# Altium footprint library heromap.PcbLib: 593 footprints (part 20 of 38)
Each footprint in its own frame and in the unit in brackets; x right, y up, seen from the top. Pads: shape width x height; smd on the part's side, far side on the other; paste and mask are expansions set on the pad; w line width, h text height; cw(c..) or ccw(c..) is an arc to the next point about the centre after c.
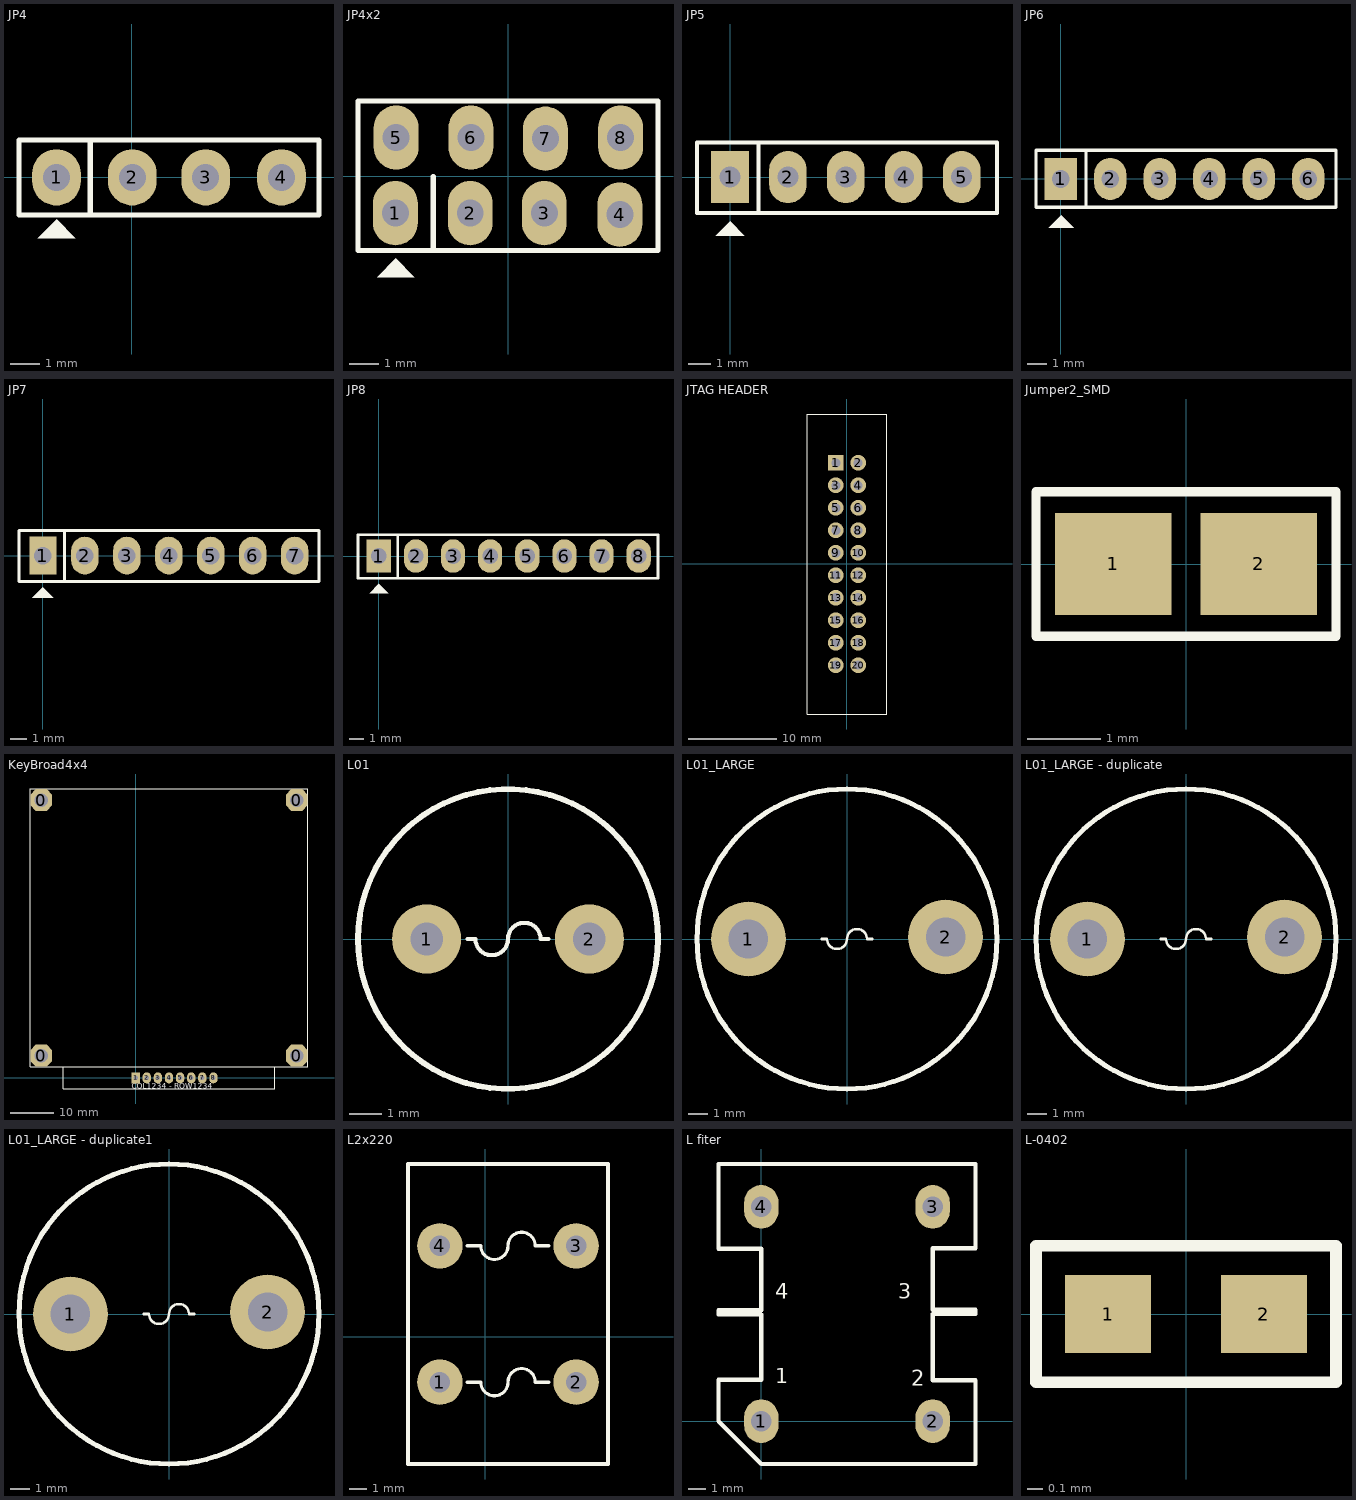
[diagram p19: the footprints below, top view; thin cyan lines are the x and y axes]

## JP4 [mil] "Jumper 4"
height 200
pads (4):
  oval 65x75 hole 36: 1(-100,0) 2(1,0) 3(99,0) 4(200,0)
Top Overlay:
  region: -100,-56 -125,-81 -75,-81
  lines w7: -55,-50 -55,49 ; -150,-50 250,-50 250,50 -150,50 -150,-50

## JP4x2 [mil] "Connector 4x2"
height 200
pads (8):
  oval 60x86 hole 36: 1(-150.5,-49.5) 2(-50.5,-49.5) 3(48.5,-49.5) 4(149.5,-51.5) 5(-149.5,51.5) 6(-49.5,51.5) 7(50,50) 8(150.5,51.5)
Top Overlay:
  region: -150,-110 -175,-135 -125,-135
  lines w7: -100,-99 -100,-1 ; -200.5,-99.5 -200.5,0.5 -200.5,100.5 200.5,100.5 200.5,-99.5 -200.5,-99.5

## JP5 [mil] "JP5"
height 200
pads (5):
  rect 65x90 hole 36: 1(0,0)
  oval 65x90 hole 36: 2(100,0) 3(200,0) 4(300,0) 5(400,0)
Top Overlay:
  region: 0,-76 -25,-101 25,-101
  lines w7: 49,-60 49,58 ; -57,-62 461,-62 461,60 -57,60 -57,-62

## JP6 [mil] "JP6"
height 200
pads (6):
  rect 65x85 hole 36: 1(0,0)
  oval 65x85 hole 36: 2(100,0) 3(200,0) 4(300,0) 5(400,0) 6(500,0)
Top Overlay:
  region: 1,-74 -24,-99 26,-99
  lines w7: 51,-57 51,56 ; -50,-57 556,-57 556,58 -50,58 -50,-57

## JP7 [mil] "JP7"
height 200
pads (7):
  rect 65x90 hole 42: 1(0,0)
  oval 65x90 hole 42: 2(100,0) 3(200,0) 4(300,0) 5(400,0) 6(500,0) 7(600,0)
Top Overlay:
  region: 0,-75 -25,-100 25,-100
  lines w7: 51,-58 51,60 ; -57,-62 -57,60 658,60 658,-62 -57,-62

## JP8 [mil] "JP8"
height 200
pads (8):
  rect 65x90 hole 42: 1(0,0)
  oval 65x90 hole 42: 2(100,0) 3(200,0) 4(300,0) 5(400,0) 6(500,0) 7(600,0) 8(700,0)
Top Overlay:
  region: 0,-75 -25,-100 25,-100
  lines w7: 51,-60 51,56 ; -56,-60 752,-60 752,57 -56,57 -56,-60

## JTAG HEADER [mil]
pads (20):
  rect 70x70 hole 40: 1(-49,449)
  round 70 hole 40: 2(51,449) 3(-49,349) 4(51,349) 5(-49,249) 6(51,249) 7(-49,149) 8(51,149) 9(-49,49) 10(51,49) 11(-49,-51) 12(51,-51) 13(-49,-151) 14(51,-151) 15(-49,-251) 16(51,-251) 17(-49,-351) 18(51,-351) 19(-49,-451) 20(51,-451)
Top Overlay:
  lines w4: -66,665.85 9,665.85 ; -176.48,-667.85 -176.48,665.85 178.48,665.85 178.48,-667.85 -176.48,-667.85
3D body: height 354.33, standoff 0, extent -160,-647.85 158.48,645.85
3D body: height 314.96, standoff -39.37, extent 31.02,-470.98 70.98,-431.02
3D body: height 314.96, standoff -39.37, extent -69.98,-469.98 -30.02,-430.02
3D body: height 314.96, standoff -39.37, extent -68.98,-370.98 -29.02,-331.02
3D body: height 314.96, standoff -39.37, extent 31.02,-370.98 70.98,-331.02
3D body: height 314.96, standoff -39.37, extent 31.02,-270.98 70.98,-231.02
3D body: height 314.96, standoff -39.37, extent -68.98,-270.98 -29.02,-231.02
3D body: height 314.96, standoff -39.37, extent 31.02,-170.98 70.98,-131.02
3D body: height 314.96, standoff -39.37, extent -68.98,-170.98 -29.02,-131.02
3D body: height 314.96, standoff -39.37, extent 31.02,-70.98 70.98,-31.02
3D body: height 314.96, standoff -39.37, extent -68.98,-70.98 -29.02,-31.02
3D body: height 314.96, standoff -39.37, extent 31.02,29.02 70.98,68.98
3D body: height 314.96, standoff -39.37, extent -68.98,29.02 -29.02,68.98
3D body: height 314.96, standoff -39.37, extent 31.02,129.02 70.98,168.98
3D body: height 314.96, standoff -39.37, extent -68.98,129.02 -29.02,168.98
3D body: height 314.96, standoff -39.37, extent -68.98,229.02 -29.02,268.98
3D body: height 314.96, standoff -39.37, extent 31.02,229.02 70.98,268.98
3D body: height 314.96, standoff -39.37, extent 31.02,329.02 70.98,368.98
3D body: height 314.96, standoff -39.37, extent -68.98,329.02 -29.02,368.98
3D body: height 314.96, standoff -39.37, extent 31.02,429.02 70.98,468.98
3D body: height 314.96, standoff -39.37, extent -68.98,429.02 -29.02,468.98
3D body: height 39.37, standoff 0, extent -140,-630 145,630
3D body: height 196.85, standoff 0, extent -160,-100 -140,100

## Jumper2_SMD [mm] "Compoment SMD 80x50mil"
height 1.27
pads (2):
  rect 1.6x1.397 smd: 1(-1,0) 2(1,0)
Top Overlay:
  lines w0.127: -2.057,-0.991 -2.057,0.991 2.057,0.991 2.057,-0.991 -2.057,-0.991
3D body "SW3dPS-0805 SMD Resistor.STEP": height 0.78, standoff 0, extent -1,-0.625 1,0.625

## KeyBroad4x4 [mm] "KeyBroad 4x4"
height 5.08
pads (12):
  oct 5x5 hole 3.048: 0(-21.59,5.08) 0(-21.59,63.5) 0(36.83,5.08) 0(36.83,63.5)
  rect 1.905x2.5 hole 1: 1(0,0)
  oval 1.905x2.5 hole 1: 2(2.54,0) 3(5.08,0) 4(7.62,0) 5(10.16,0) 6(12.7,0) 7(15.24,0) 8(17.78,0)
Top Overlay:
  lines w0.203: -16.51,2.54 -16.51,-2.515 -16.535,-2.54 31.75,-2.54 31.75,2.489 ; -24.13,2.54 -24.13,66.04 39.37,66.04 39.37,2.54 -24.13,2.54
  text "COL1234 - ROW1234" at -0.889,-2.464 h1.27

## L01 [mil] "Inductor"
pads (2):
  round 85 hole 40: 1(-100,0) 2(100,0)
Top Overlay:
  circle w7: c0,0 r184.39
  lines w5: -50,0 -40,0 ccw(c-20,0) 0,0 cw(c20,0) 40,0 50,0
3D body "Inductor 10x12 (200 mils).STEP": height 473.04, standoff -156.88, extent -196.85,-198.22 196.85,195.48

## L01_LARGE [mm] "Inductor"
pads (2):
  round 3.8 hole 2: 1(-5,0) 2(5,0.1)
Top Overlay:
  circle w0.254: c0,0 r7.611
  lines w0.127: -1.27,0 -1.016,0 ccw(c-0.508,0) 0,0 cw(c0.508,0) 1.016,0 1.27,0

## L01_LARGE - duplicate [mm] "Inductor"
pads (2):
  round 3.8 hole 2: 1(-5,0) 2(5,0.1)
Top Overlay:
  circle w0.254: c0,0 r7.611
  lines w0.127: -1.27,0 -1.016,0 ccw(c-0.508,0) 0,0 cw(c0.508,0) 1.016,0 1.27,0

## L01_LARGE - duplicate1 [mm] "Inductor"
pads (2):
  round 3.8 hole 2: 1(-5,0) 2(5,0.1)
Top Overlay:
  circle w0.254: c0,0 r7.611
  lines w0.127: -1.27,0 -1.016,0 ccw(c-0.508,0) 0,0 cw(c0.508,0) 1.016,0 1.27,0

## L2x220 [mil] "Loc 220"
pads (4):
  round 100 hole 45: 1(-100,-100) 2(200,-100) 3(200,200) 4(-100,200)
Top Overlay:
  lines w7: -10,-100 ccw(c20,-100) 50,-100 cw(c80,-100) 110,-100 ; -10,200 ccw(c20,200) 50,200 cw(c80,200) 110,200
  lines w8: -40,-100 -10,-100 ; -40,200 -10,200 ; 110,-100 140,-100 ; 110,200 140,200 ; -170,-280 270,-280 270,380 -170,380 -170,-280

## L fiter [mm] "Fiter"
pads (4):
  oval 2x2.54 hole 1.2: 1(0,0) 2(10,0) 3(10,12.5) 4(0,12.5)
Top Overlay:
  lines w0.254: 12.5,-2.5 12.5,2.388 10,2.388 10,6.248 12.5,6.248 12.5,6.502 10,6.502 10,10.084 12.5,10.084 12.5,15 7.373,15 -2.5,15 -2.5,12.497 -2.5,10.058 0,10.058 0,6.477 -2.5,6.477 -2.5,6.223 0,6.223 0,2.413 -2.5,2.413 -2.5,0 0,-2.5 2,-2.5 ; 12.5,-2.5 8,-2.5 2,-2.5 ; 2,-2.5 2,-2.5
  text "2" at 8.755,1.778 h1.52
  text "1" at 0.803,1.905 h1.5
  text "3" at 8,6.86 h1.5
  text "4" at 0.803,6.86 h1.52
3D body: height 18, standoff 1.5, extent 2.616,10.484 3.378,14.929
3D body: height 18, standoff 1.5, extent 7.087,-2.426 7.849,2.019
3D body: height 18, standoff 1.5, extent 7.036,10.51 7.798,14.955
3D body: height 18, standoff 1.5, extent 2.591,-2.464 3.353,1.981
3D body: height 18, standoff 0, extent -2.523,1.823 12.477,2.223
3D body: height 18, standoff 0, extent -2.5,6.125 12.5,6.525
3D body: height 18, standoff 0, extent -2.478,10.189 12.522,10.589
3D body: height 4.5, standoff 1.5, extent -2.5,10.453 12.5,15
3D body: height 4.5, standoff 1.5, extent -2.5,-2.5 12.5,2
3D body: height 1.5, standoff 0, extent 4.5,-2.5 6,-1
3D body: height 1, standoff -4, extent -0.496,-0.499 0.5,0.499
3D body: height 1, standoff -4, extent 9.5,11.998 10.496,12.996
3D body: height 1, standoff -4, extent -0.499,11.997 0.499,12.993
3D body: height 1, standoff -4, extent 9.501,-0.496 10.499,0.5
3D body: height 21, standoff 10, extent 3.632,-2.515 6.807,15.037
3D body: height 15, standoff 9, extent 1.219,2.007 8.755,10.465

## L-0402 [mil]
pads (2):
  rect 22x20 smd: 1(-20,0) 2(20,0)
Top Overlay:
  lines w3: -38.5,-17.5 -38.5,17.5 38.5,17.5 38.5,-17.5 -38.5,-17.5
3D body "User Library-cap_0402.STEP": height 19.68, standoff 0, extent -19.68,-9.84 19.69,9.85